# Altium footprint library my_AP_lib_pcb.PcbLib: 115 footprints (part 3 of 8)
Each footprint in its own frame and in the unit in brackets; x right, y up, seen from the top. Pads: shape width x height; smd on the part's side, far side on the other; paste and mask are expansions set on the pad; w line width, h text height; cw(c..) or ccw(c..) is an arc to the next point about the centre after c.
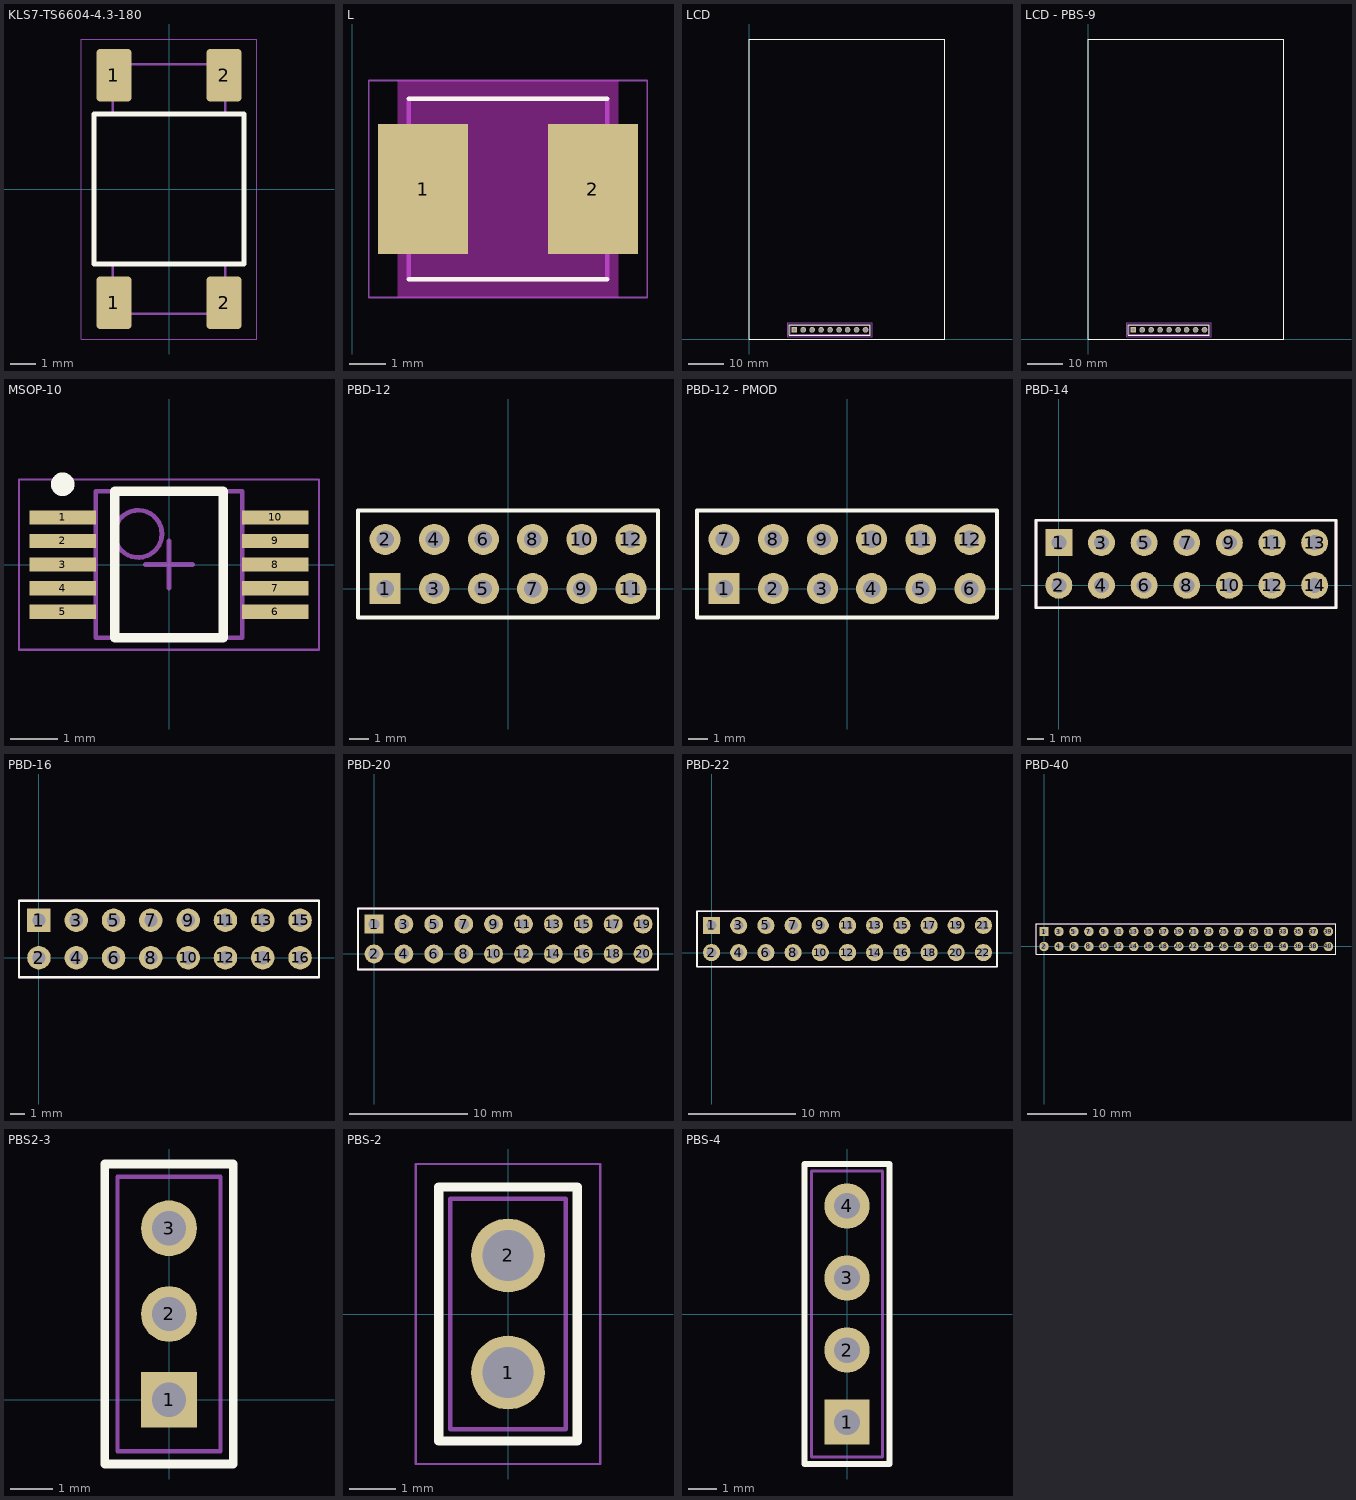
[diagram p2: the footprints below, top view; thin cyan lines are the x and y axes]

## KLS7-TS6604-4.3-180 [mm]
height 8
pads (4):
  rrect20% 1.4x2.1 smd mask+0.05: 1(-2.2,-4.55) 1(-2.2,4.55) 2(2.2,-4.55) 2(2.2,4.55)
Top Overlay:
  lines w0.2: -3,-3 -3,3 3,3 3,-3 -3,-3
Mechanical 5:
  lines w0.1: -2.25,-3 -2.25,-5 2.25,-5 2.25,-3.025 ; -2.25,3.05 -2.25,5 2.25,5 2.25,3 ; -3,-3 -3,3 3,3 3,-3 -3,-3
  text ".Designator" at -2.5,-1.75 h5
Mechanical 9:
  lines w0.05: -3.5,-6 -3.5,6 3.5,6 3.5,-6 -3.5,-6
3D body "FSM8JSMATR.STEP": height 6, standoff -0.13, extent -3,-5.675 3,5.675

## L [mm]
pads (2):
  rect 2.5x3.6 smd: 1(1.961,4.739) 2(6.661,4.739)
Top Overlay:
  lines w0.127: 1.561,2.239 7.061,2.239 ; 1.561,7.239 7.061,7.239
Keep-Out Layer:
  region: 7.361,6.539 5.411,6.539 5.411,2.939 7.361,2.939 7.361,1.739 1.261,1.739 1.261,2.939 3.211,2.939 3.211,6.539 1.261,6.539 1.261,7.739 7.361,7.739
  region: 7.361,6.539 5.411,6.539 5.411,2.939 7.361,2.939 7.361,1.739 1.261,1.739 1.261,2.939 3.211,2.939 3.211,6.539 1.261,6.539 1.261,7.739 7.361,7.739
Mechanical 13:
  lines w0.127: 1.561,2.239 7.061,2.239 7.061,7.239 1.561,7.239 1.561,2.239
Mechanical 15:
  lines w0.05: 0.461,1.739 8.161,1.739 8.161,7.739 0.461,7.739 0.461,1.739

## LCD [mm]
pads (9):
  rect 1.6x1.6 hole 1.02 mask+0.05: 1(12.8,2.6)
  round 1.6 hole 1.1 mask+0.05: 2(15.34,2.6) 3(17.88,2.6) 4(20.42,2.6) 5(22.96,2.6) 6(25.5,2.6) 7(27.92,2.6) 8(30.46,2.6) 9(33,2.6)
Top Overlay:
  lines w0.2: 11.4,1.1 34.4,1.1 34.4,4.1 11.4,4.1 11.4,1.1
  lines w0.254: 0,0 55.5,0 55.5,84.96 0,84.96 0,0
Mechanical 5:
  lines w0.1: 11.65,1.35 11.65,3.85 34.15,3.85 34.15,1.35 11.65,1.35
  text ".Designator" at 19.15,2.1 h2
Mechanical 9:
  lines w0.05: 10.9,0.6 10.9,4.6 34.9,4.6 34.9,0.6 10.9,0.6
3D body "User Library-PBS-09.step": height 8.4, standoff -3.2, extent 11.47,1.35 34.33,3.89
3D body "User Library-3_5inch RPi LCD.step": height 12.75, standoff -5.55, extent 0.15,-0.2 55.65,84.8

## LCD - PBS-9 [mm]
pads (9):
  rect 1.6x1.6 hole 1.02 mask+0.05: 1(12.8,2.6)
  round 1.6 hole 1.1 mask+0.05: 2(15.34,2.6) 3(17.88,2.6) 4(20.42,2.6) 5(22.96,2.6) 6(25.5,2.6) 7(27.92,2.6) 8(30.46,2.6) 9(33,2.6)
Top Overlay:
  lines w0.2: 11.4,1.1 11.4,4.1 34.4,4.1 34.4,1.1 11.4,1.1
  lines w0.254: 0,0 0,84.96 55.5,84.96 55.5,0 0,0
Mechanical 5:
  lines w0.1: 11.65,1.35 34.15,1.35 34.15,3.85 11.65,3.85 11.65,1.35
  text ".Designator" at 19.15,2.1 h2
Mechanical 9:
  lines w0.05: 10.9,0.6 34.9,0.6 34.9,4.6 10.9,4.6 10.9,0.6
3D body "User Library-PBS-09.step": height 8.4, standoff -3.2, extent 11.47,1.35 34.33,3.89

## LED [mm]

## MSOP-10 [mm]
height 1.1
pads (10):
  rect 1.4x0.3 smd: 1(-2.25,1) 2(-2.25,0.5) 3(-2.25,0) 4(-2.25,-0.5) 5(-2.25,-1) 6(2.25,-1) 7(2.25,-0.5) 8(2.25,0) 9(2.25,0.5) 10(2.25,1)
Top Overlay:
  circle w0.25: c-2.25,1.7 r0.125
  lines w0.2: -1.15,-1.55 1.15,-1.55 1.15,1.55 -1.15,1.55 -1.15,-1.55
Mechanical 13:
  circle w0.1: c-0.65,0.65 r0.5
  lines w0.1: -1.55,-1.55 1.55,-1.55 1.55,1.55 -1.55,1.55 -1.55,-1.55
Mechanical 15:
  lines w0.05: -3.175,-1.8 3.175,-1.8 3.175,1.8 -3.175,1.8 -3.175,-1.8
  lines w0.1: -0.5,0 0.5,0 ; 0,-0.5 0,0.5
3D body: height 1.1, standoff 0.15, extent -1.55,-1.55 1.55,1.55
3D body "User Library-MSOP-10-1.step": height 1.05, standoff 0, extent -2.514,-1.5 2.514,1.5

## PBD-12 [mm] "DS1023-30-1x6"
height 8.5
pads (12):
  rect 1.6x1.6 hole 0.9 mask+0.05: 1(-6.35,0)
  round 1.6 hole 0.9 mask+0.05: 2(-6.35,2.54) 3(-3.81,0) 4(-3.81,2.54) 5(-1.27,0) 6(-1.27,2.54) 7(1.27,0) 8(1.27,2.54) 9(3.81,0) 10(3.81,2.54) 11(6.35,0) 12(6.35,2.54)
Top Overlay:
  lines w0.2: -7.75,-1.5 7.75,-1.5 7.75,4.04 -7.75,4.04 -7.75,-1.5
3D body "User Library-PBS-06.step": height 8.4, standoff -3.2, extent -7.62,1.27 7.62,3.81
3D body "User Library-PBS-06.step": height 8.4, standoff -3.2, extent -7.62,-1.27 7.62,1.27

## PBD-12 - PMOD [mm] "DS1023-30-1x6"
height 8.5
pads (12):
  rect 1.6x1.6 hole 0.9 mask+0.05: 1(-6.35,0)
  round 1.6 hole 0.9 mask+0.05: 2(-3.81,0) 3(-1.27,0) 4(1.27,0) 5(3.81,0) 6(6.35,0) 7(-6.35,2.54) 8(-3.81,2.54) 9(-1.27,2.54) 10(1.27,2.54) 11(3.81,2.54) 12(6.35,2.54)
Top Overlay:
  lines w0.2: -7.75,-1.5 -7.75,4.04 7.75,4.04 7.75,-1.5 -7.75,-1.5
3D body "User Library-PBS-06.step": height 8.4, standoff -3.2, extent -7.62,-1.27 7.62,1.27
3D body "User Library-PBS-06.step": height 8.4, standoff -3.2, extent -7.62,1.27 7.62,3.81

## PBD-14 [mm]
pads (14):
  rect 1.6x1.6 hole 0.9: 1(0,2.54)
  round 1.6 hole 0.9: 2(0,0) 3(2.54,2.54) 4(2.54,0) 5(5.08,2.54) 6(5.08,0) 7(7.62,2.54) 8(7.62,0) 9(10.16,2.54) 10(10.16,0) 11(12.7,2.54) 12(12.7,0) 13(15.24,2.54) 14(15.24,0)
Top Overlay:
  lines w0.15: -1.36,-1.33 16.51,-1.33 16.51,3.87 -1.36,3.87 -1.36,-1.33
Mechanical 15:
  lines w0.15: -1.36,-1.33 16.51,-1.33 16.51,3.87 -1.36,3.87 -1.36,-1.33
3D body "User Library-PBS-02.step": height 8.4, standoff -3.2, extent 13.97,-1.23 16.51,3.85
3D body "User Library-PBS-02.step": height 8.4, standoff -3.2, extent 11.43,-1.23 13.97,3.85
3D body "User Library-PBS-02.step": height 8.4, standoff -3.2, extent 8.89,-1.23 11.43,3.85
3D body "User Library-PBS-02.step": height 8.4, standoff -3.2, extent 6.35,-1.23 8.89,3.85
3D body "User Library-PBS-02.step": height 8.4, standoff -3.2, extent 3.81,-1.23 6.35,3.85
3D body "User Library-PBS-02.step": height 8.4, standoff -3.2, extent 1.27,-1.23 3.81,3.85
3D body "User Library-PBS-02.step": height 8.4, standoff -3.2, extent -1.27,-1.23 1.27,3.85

## PBD-16 [mm]
pads (16):
  rect 1.6x1.6 hole 0.9: 1(0,2.54)
  round 1.6 hole 0.9: 2(0,0) 3(2.54,2.54) 4(2.54,0) 5(5.08,2.54) 6(5.08,0) 7(7.62,2.54) 8(7.62,0) 9(10.16,2.54) 10(10.16,0) 11(12.7,2.54) 12(12.7,0) 13(15.24,2.54) 14(15.24,0) 15(17.78,2.54) 16(17.78,0)
Top Overlay:
  lines w0.15: -1.36,-1.33 -1.36,3.87 19.07,3.87 19.07,-1.33 -1.36,-1.33
Mechanical 15:
  lines w0.15: -1.36,-1.33 -1.36,3.87 19.07,3.87 19.07,-1.33 -1.36,-1.33
3D body "User Library-PBS-02.step": height 8.4, standoff -3.2, extent -1.27,-1.23 1.27,3.85
3D body "User Library-PBS-02.step": height 8.4, standoff -3.2, extent 1.27,-1.23 3.81,3.85
3D body "User Library-PBS-02.step": height 8.4, standoff -3.2, extent 3.81,-1.23 6.35,3.85
3D body "User Library-PBS-02.step": height 8.4, standoff -3.2, extent 6.35,-1.23 8.89,3.85
3D body "User Library-PBS-02.step": height 8.4, standoff -3.2, extent 8.89,-1.23 11.43,3.85
3D body "User Library-PBS-02.step": height 8.4, standoff -3.2, extent 11.43,-1.23 13.97,3.85
3D body "User Library-PBS-02.step": height 8.4, standoff -3.2, extent 13.97,-1.23 16.51,3.85
3D body "User Library-PBS-02.step": height 8.4, standoff -3.2, extent 16.51,-1.23 19.05,3.85

## PBD-20 [mm]
pads (20):
  rect 1.6x1.6 hole 0.9: 1(0,2.54)
  round 1.6 hole 0.9: 2(0,0) 3(2.54,2.54) 4(2.54,0) 5(5.08,2.54) 6(5.08,0) 7(7.62,2.54) 8(7.62,0) 9(10.16,2.54) 10(10.16,0) 11(12.7,2.54) 12(12.7,0) 13(15.24,2.54) 14(15.24,0) 15(17.78,2.54) 16(17.78,0) 17(20.32,2.54) 18(20.32,0) 19(22.86,2.54) 20(22.86,0)
Top Overlay:
  lines w0.15: -1.36,-1.33 24.13,-1.33 24.13,3.87 -1.36,3.87 -1.36,-1.33
Mechanical 15:
  lines w0.15: -1.36,-1.33 -1.36,3.87 24.13,3.87 24.13,-1.33 -1.36,-1.33
3D body "User Library-PBS-02.step": height 8.4, standoff -3.2, extent 21.59,-1.23 24.13,3.85
3D body "User Library-PBS-02.step": height 8.4, standoff -3.2, extent 19.05,-1.23 21.59,3.85
3D body "User Library-PBS-02.step": height 8.4, standoff -3.2, extent 16.51,-1.23 19.05,3.85
3D body "User Library-PBS-02.step": height 8.4, standoff -3.2, extent 13.97,-1.23 16.51,3.85
3D body "User Library-PBS-02.step": height 8.4, standoff -3.2, extent 11.43,-1.23 13.97,3.85
3D body "User Library-PBS-02.step": height 8.4, standoff -3.2, extent 8.89,-1.23 11.43,3.85
3D body "User Library-PBS-02.step": height 8.4, standoff -3.2, extent 6.35,-1.23 8.89,3.85
3D body "User Library-PBS-02.step": height 8.4, standoff -3.2, extent 3.81,-1.23 6.35,3.85
3D body "User Library-PBS-02.step": height 8.4, standoff -3.2, extent 1.27,-1.23 3.81,3.85
3D body "User Library-PBS-02.step": height 8.4, standoff -3.2, extent -1.27,-1.23 1.27,3.85

## PBD-22 [mm]
pads (22):
  rect 1.6x1.6 hole 0.9: 1(0,2.54)
  round 1.6 hole 0.9: 2(0,0) 3(2.54,2.54) 4(2.54,0) 5(5.08,2.54) 6(5.08,0) 7(7.62,2.54) 8(7.62,0) 9(10.16,2.54) 10(10.16,0) 11(12.7,2.54) 12(12.7,0) 13(15.24,2.54) 14(15.24,0) 15(17.78,2.54) 16(17.78,0) 17(20.32,2.54) 18(20.32,0) 19(22.86,2.54) 20(22.86,0) 21(25.4,2.54) 22(25.4,0)
Top Overlay:
  lines w0.15: -1.36,-1.33 -1.36,3.87 26.67,3.87 26.67,-1.33 -1.36,-1.33
Mechanical 15:
  lines w0.15: -1.36,-1.33 26.67,-1.33 26.67,3.87 -1.36,3.87 -1.36,-1.33
3D body "User Library-PBS-02.step": height 8.4, standoff -3.2, extent 24.13,-1.23 26.67,3.85
3D body "User Library-PBS-02.step": height 8.4, standoff -3.2, extent -1.27,-1.23 1.27,3.85
3D body "User Library-PBS-02.step": height 8.4, standoff -3.2, extent 1.27,-1.23 3.81,3.85
3D body "User Library-PBS-02.step": height 8.4, standoff -3.2, extent 3.81,-1.23 6.35,3.85
3D body "User Library-PBS-02.step": height 8.4, standoff -3.2, extent 6.35,-1.23 8.89,3.85
3D body "User Library-PBS-02.step": height 8.4, standoff -3.2, extent 8.89,-1.23 11.43,3.85
3D body "User Library-PBS-02.step": height 8.4, standoff -3.2, extent 11.43,-1.23 13.97,3.85
3D body "User Library-PBS-02.step": height 8.4, standoff -3.2, extent 13.97,-1.23 16.51,3.85
3D body "User Library-PBS-02.step": height 8.4, standoff -3.2, extent 16.51,-1.23 19.05,3.85
3D body "User Library-PBS-02.step": height 8.4, standoff -3.2, extent 19.05,-1.23 21.59,3.85
3D body "User Library-PBS-02.step": height 8.4, standoff -3.2, extent 21.59,-1.23 24.13,3.85

## PBD-40 [mm]
pads (40):
  rect 1.6x1.6 hole 0.9: 1(0,2.54)
  round 1.6 hole 0.9: 2(0,0) 3(2.54,2.54) 4(2.54,0) 5(5.08,2.54) 6(5.08,0) 7(7.62,2.54) 8(7.62,0) 9(10.16,2.54) 10(10.16,0) 11(12.7,2.54) 12(12.7,0) 13(15.24,2.54) 14(15.24,0) 15(17.78,2.54) 16(17.78,0) 17(20.32,2.54) 18(20.32,0) 19(22.86,2.54) 20(22.86,0) 21(25.4,2.54) 22(25.4,0) 23(27.94,2.54) 24(27.94,0) 25(30.48,2.54) 26(30.48,0) 27(33.02,2.54) 28(33.02,0) 29(35.56,2.54) 30(35.56,0) 31(38.1,2.54) 32(38.1,0) 33(40.64,2.54) 34(40.64,0) 35(43.18,2.54) 36(43.18,0) 37(45.72,2.54) 38(45.72,0) 39(48.26,2.54) 40(48.26,0)
Top Overlay:
  lines w0.15: -1.36,-1.33 49.55,-1.33 49.55,3.87 -1.36,3.87 -1.36,-1.33
Mechanical 15:
  lines w0.15: -1.36,-1.33 49.55,-1.33 49.55,3.87 -1.36,3.87 -1.36,-1.33
3D body "User Library-PBS-02.step": height 8.4, standoff -3.2, extent 46.99,-1.23 49.53,3.85
3D body "User Library-PBS-02.step": height 8.4, standoff -3.2, extent 44.45,-1.23 46.99,3.85
3D body "User Library-PBS-02.step": height 8.4, standoff -3.2, extent 41.91,-1.23 44.45,3.85
3D body "User Library-PBS-02.step": height 8.4, standoff -3.2, extent 39.37,-1.23 41.91,3.85
3D body "User Library-PBS-02.step": height 8.4, standoff -3.2, extent 36.83,-1.23 39.37,3.85
3D body "User Library-PBS-02.step": height 8.4, standoff -3.2, extent 34.29,-1.23 36.83,3.85
3D body "User Library-PBS-02.step": height 8.4, standoff -3.2, extent 31.75,-1.23 34.29,3.85
3D body "User Library-PBS-02.step": height 8.4, standoff -3.2, extent 29.21,-1.23 31.75,3.85
3D body "User Library-PBS-02.step": height 8.4, standoff -3.2, extent 26.67,-1.23 29.21,3.85
3D body "User Library-PBS-02.step": height 8.4, standoff -3.2, extent 24.13,-1.23 26.67,3.85
3D body "User Library-PBS-02.step": height 8.4, standoff -3.2, extent 21.59,-1.23 24.13,3.85
3D body "User Library-PBS-02.step": height 8.4, standoff -3.2, extent 19.05,-1.23 21.59,3.85
3D body "User Library-PBS-02.step": height 8.4, standoff -3.2, extent 16.51,-1.23 19.05,3.85
3D body "User Library-PBS-02.step": height 8.4, standoff -3.2, extent 13.97,-1.23 16.51,3.85
3D body "User Library-PBS-02.step": height 8.4, standoff -3.2, extent 11.43,-1.23 13.97,3.85
3D body "User Library-PBS-02.step": height 8.4, standoff -3.2, extent 8.89,-1.23 11.43,3.85
3D body "User Library-PBS-02.step": height 8.4, standoff -3.2, extent 6.35,-1.23 8.89,3.85
3D body "User Library-PBS-02.step": height 8.4, standoff -3.2, extent 3.81,-1.23 6.35,3.85
3D body "User Library-PBS-02.step": height 8.4, standoff -3.2, extent 1.27,-1.23 3.81,3.85
3D body "User Library-PBS-02.step": height 8.4, standoff -3.2, extent -1.27,-1.23 1.27,3.85

## PBS2-3 [mm]
height 1
pads (3):
  rect 1.3x1.3 hole 0.8: 1(0,0)
  round 1.3 hole 0.8: 2(0,2) 3(0,4)
Top Overlay:
  lines w0.2: -1.5,-1.5 1.5,-1.5 1.5,5.5 -1.5,5.5 -1.5,-1.5
Mechanical 1:
  lines w0.1: -1.2,-1.2 1.2,-1.2 1.2,5.2 -1.2,5.2 -1.2,-1.2
3D body: height 4.3, standoff 0, extent -1.2,-1.2 1.2,5.2

## PBS-2 [mm]
height 1
pads (2):
  round 1.6 hole 1.1 mask+0.05: 1(0,-1.27) 2(0,1.27)
Top Overlay:
  lines w0.2: -1.5,-2.75 1.5,-2.75 1.5,2.75 -1.5,2.75 -1.5,-2.75
Mechanical 5:
  lines w0.1: -1.25,-2.5 1.25,-2.5 1.25,2.5 -1.25,2.5 -1.25,-2.5
  text ".Designator" at 0.75,-2 h2
Mechanical 9:
  lines w0.05: -2,-3.25 2,-3.25 2,3.25 -2,3.25 -2,-3.25
3D body "User Library-PBS-02.step": height 8.4, standoff -3.2, extent -1.27,-2.5 1.27,2.58

## PBS-4 [mm]
height 1
pads (4):
  rect 1.6x1.6 hole 0.9 mask+0.05: 1(0,-3.81)
  round 1.6 hole 0.9 mask+0.05: 2(0,-1.27) 3(0,1.27) 4(0,3.81)
Top Overlay:
  lines w0.2: -1.5,-5.29 -1.5,5.29 1.5,5.29 1.5,-5.29 -1.5,-5.29
Mechanical 1:
  lines w0.1: -1.25,-5.04 1.25,-5.04 1.25,5.04 -1.25,5.04 -1.25,-5.04
3D body "User Library-PBS-02.step": height 8.4, standoff -3.2, extent -1.27,0.04 1.27,5.12
3D body "User Library-PBS-02.step": height 8.4, standoff -3.2, extent -1.27,-5.04 1.27,0.04